# Altium schematic symbol library Schlib.SchLib: 725 symbols (part 2 of 6)
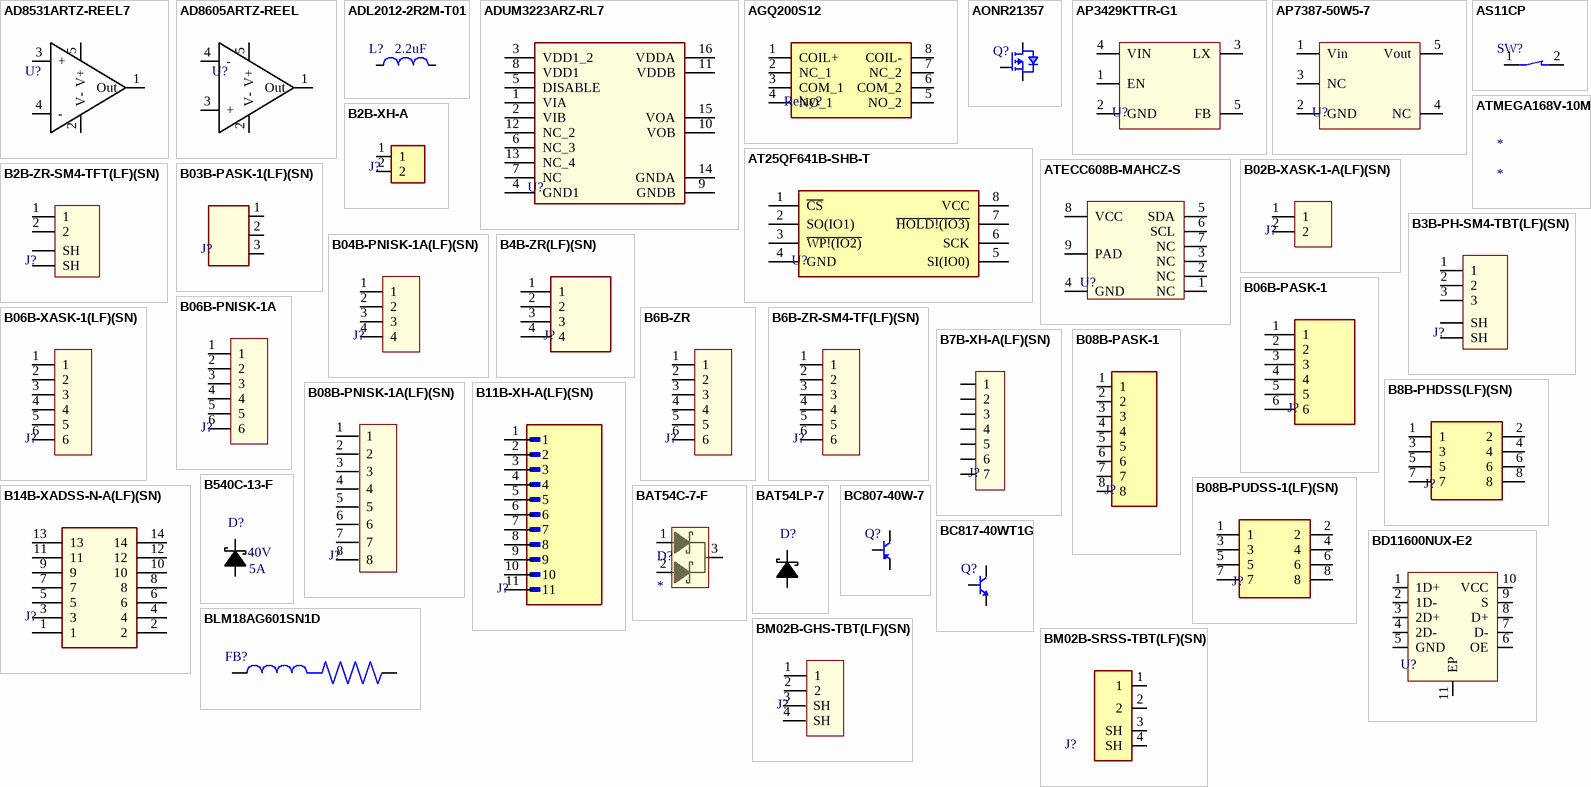
[diagram p22: symbols AD8531ARTZ-REEL7 to BM02B-SRSS-TBT(LF)(SN)]

## AT25QF641B-SHB-T
designator U?  (value not drawn)
Serial Flash Memory 64Mbit 104MHz 2.7V to 3.6V 8-Pin SOP T/R; Manufacturer: Renesas; Manufacturer Part Number: AT25QF641B-SHB-T; Package Body Material: Plastic; Data Retention Time-Min: 20; Endurance: 100000Cycles; Density: 67108864b; Memory Width: 8; Channels: 1; Number of Words Code: 8M; Operating Mode: SYNCHRONOUS; Output Characteristics: 3-STATE; Package Equivalence Code: SOP8,.3; Programming Voltage: 3V; Serial Bus Type: SPI; Standby Current-Max: 25uA; Max Supply Current: 19mA; Write Protection: HARDWARE/SOFTWARE; Supplier: Mouser; Supplier Part Number: 724-AT25QF641B-SHB-T; RoHS: Yes; Category: Memory; Stock: 8673; Pricing: 1=1.14, 10=1.02, 50=1.02, 100=0.994, 1000=0.918, 10000=0.859 (USD); Pins: 8; Case/Package: SOP; Package Shape: Rectangular; Min Operating Temperature: -40°C; Max Operating Temperature: 85°C; Memory Format: FLASH; Type: NOR TYPE; JESD-30 Code: R-PDSO-G8; Moisture Sensitivity Level: 3; Parallel/Serial: SERIAL; Surface Mount: Yes; Technology: CMOS; Terminal Form: Gull Wing; Terminal Position: DUAL; Clock Frequency: 104MHz; Min Supply Voltage: 2.7V; Max Supply Voltage: 3.6V; Nominal Supply Voltage: 3V; Length: 5.29mm; Width: 5.24mm; Height - Seated (Max): 2.16mm; Terminal Pitch: 1.27mm; RoHS Compliant: Yes; Reach SVHC Compliant: No; Temperature Grade: INDUSTRIAL
footprint 8-SOIC
pins: 1 ~{CS}, 2 SO(IO1), 3 ~{WP!(IO2)}, 4 GND, 5 SI(IO0), 6 SCK, 7 ~{HOLD!(IO3)}, 8 VCC

## ATECC608B-MAHCZ-S
designator U?  (value not drawn)
ECC/ECDH SWI, small 3K reel UDFN 8 UDFN 2x3x0.6mm T/R RoHS Compliant: Yes; Manufacturer: Microchip; Manufacturer Part Number: ATECC608B-MAHCZ-S; Supplier: Digi-Key; Supplier Part Number: 150-ATECC608B-MAHCZ-SCT-ND; RoHS: Yes; Stock: 16896; Pricing: 1=0.95000, 25=0.87000 (USD)
footprint ATECC608B-MAHCZ-S
pins: 1 NC, 2 NC, 3 NC, 4 GND, 5 SDA, 6 SCL, 7 NC, 8 VCC, 9 PAD

## ATMEGA168V-10MU
designator *
ATMEGA168V-10MU, 8bit AVR Microcontroller, 10MHz, 16 kB Flash, 32-Pin QFN; Manufacturer: Microchip; Supplier: Arrow Electronics; Supplier Part Number: ATMEGA168V-10MU; Manufacturer Part Number: ATMEGA168V-10MU; RoHS: Yes; Stock: 490; Pricing: 1=3.57 (USD); ComponentLink1URL: https://datasheet.ciiva.com/15122/getdatasheetpartid-87206-15122156.pdf?src-supplier=Verical; ComponentLink1Description: https://datasheet.ciiva.com/15122/getdatasheetpartid-87206-15122156.pdf?src-supplier=Verical; ComponentLink2URL: https://datasheet.ciiva.com/1162/26390-1162032.pdf?src-supplier=Farnell; ComponentLink2Description: https://datasheet.ciiva.com/1162/26390-1162032.pdf?src-supplier=Farnell; ComponentLink3URL: https://datasheet.ciiva.com/6657/2545s-6657574.pdf?src-supplier=Digikey; ComponentLink3Description: https://datasheet.ciiva.com/6657/2545s-6657574.pdf?src-supplier=Digikey; ComponentLink4URL: https://datasheet.ciiva.com/4839/doc2545-53048-4839128.pdf?src-supplier=Mouser; ComponentLink4Description: https://datasheet.ciiva.com/4839/doc2545-53048-4839128.pdf?src-supplier=Mouser; ComponentLink5URL: https://datasheet.ciiva.com/3203/doc2545-3203087.pdf?src-supplier=Avnet; ComponentLink5Description: https://datasheet.ciiva.com/3203/doc2545-3203087.pdf?src-supplier=Avnet; ComponentLink6URL: https://datasheet.ciiva.com/16936/70123998-16936205.pdf?src-supplier=Allied+Electronics; ComponentLink6Description: https://datasheet.ciiva.com/16936/70123998-16936205.pdf?src-supplier=Allied+Electronics; ComponentLink7URL: https://datasheet.ciiva.com/1157/26390-1157458.pdf?src-supplier=Element14; ComponentLink7Description: https://datasheet.ciiva.com/1157/26390-1157458.pdf?src-supplier=Element14; ComponentLink8URL: https://datasheet.ciiva.com/19480/847105-19480231.pdf?src-supplier=Jameco; ComponentLink8Description: https://datasheet.ciiva.com/19480/847105-19480231.pdf?src-supplier=Jameco

## B02B-XASK-1-A(LF)(SN)
designator J?  (value not drawn)
XA Series 2 Position 2.5mm Pitch Top Entry with Boss ThroughHole Shrouded Header; Manufacturer: JST; Manufacturer Part Number: B02B-XASK-1-A(LF)(SN); Supplier: Future Electronics; Supplier Part Number: 4958039; RoHS: Yes; Category: Headers and Wire Housings; Pricing: 1=0.0949, 400=0.0914, 1500=0.0869, 4000=0.0837, 15000=0.0766 (USD); ComponentLink1URL: https://datasheet.ciiva.com/16422/jstb02b-xask-1-a-lf-sn-16422925.pdf?src-supplier=Future+Electronics; ComponentLink1Description: https://datasheet.ciiva.com/16422/jstb02b-xask-1-a-lf-sn-16422925.pdf?src-supplier=Future+Electronics
footprint B02B-XASK-1
pins: 1, 2

## B2B-XH-A
designator J?  (value not drawn)
Connector Header Through Hole 2 position 0.098" (2.50mm); Manufacturer Part Number: B2B-XH-A
footprint JST_B2B-XH-A
pins: 1, 2

## B2B-ZR-SM4-TFT(LF)(SN)
designator J?  (value not drawn)
Conn Shrouded Header HDR 2 POS 1.5mm Solder ST SMD Embossed T/R; Manufacturer: JST; Manufacturer Part Number: B2B-ZR-SM4-TFT(LF)(SN); Number of Contacts: 2NUMBER; Current Rating: 1A; Supplier: Future Electronics; Supplier Part Number: 9517889; RoHS: Yes; Category: Headers and Wire Housings; Stock: 3000; Pricing: 1000=0.305, 2000=0.3, 3000=0.295, 4000=0.29, 5000=0.285 (USD); Lead Free: 5697LeadFree; ComponentLink1URL: https://datasheet.ciiva.com/16417/ezr-16417686.pdf?src-supplier=Future+Electronics; ComponentLink1Description: https://datasheet.ciiva.com/16417/ezr-16417686.pdf?src-supplier=Future+Electronics; ComponentLink2URL: https://datasheet.ciiva.com/26948/getdatasheetpartid-425425-26948538.pdf?src-supplier=Verical; ComponentLink2Description: https://datasheet.ciiva.com/26948/getdatasheetpartid-425425-26948538.pdf?src-supplier=Verical
footprint B2B-ZR-SM4-TFT(LF)(SN)
pins: 1, 2, SH, SH

## B03B-PASK-1(LF)(SN)
designator J?
Connector Header, PA Series, Top Entry, 3 Position, Male Pin, 1 Row, 2.0mm, Through Hole, Natural, With Boss; Part Number: B03B-PASK-1; Manufacturer: JST; Manufacturer Part Number: B03B-PASK-1(LF)(SN); Number of Positions: 3; Current Rating: 3A; Voltage Rating: 250V; Pitch: 2mm; Mated Stacking Heights: 14.9mm; Supplier: Future Electronics; Supplier Part Number: 4332029; RoHS: Yes; Category: Connectors; Stock: 8812; Pricing: 1=0.121, 250=0.118, 750=0.116, 2500=0.113, 7500=0.109 (USD); Mounting Technology: Through Hole; Contact Material: Copper Alloy; Housing Color: White; Contact Shape: Square; Contact Finish - Mating: TIN; Insulation Material: PBT; Insulation Color: Natural; Number of Rows: 1; Fastening Type: Ramp; Packaging: Bulk; Termination: Solder; Number of Contacts: 3; Series: PA; Contact Type: Male Pin; Orientation: Straight; Connector Type: Header; Lead Free: Lead Free; Flammability Rating: UL94 V-0; ComponentLink1URL: https://datasheet.ciiva.com/11750/0900766b805ad157-11750606.pdf?src-supplier=Rs; ComponentLink1Description: https://datasheet.ciiva.com/11750/0900766b805ad157-11750606.pdf?src-supplier=Rs; ComponentLink2URL: https://datasheet.ciiva.com/712/epa-f-712524.pdf?src-supplier=Digikey; ComponentLink2Description: https://datasheet.ciiva.com/712/epa-f-712524.pdf?src-supplier=Digikey; ComponentLink3URL: https://datasheet.ciiva.com/16422/jstb03b-pask-1-lf-sn-16422935.pdf?src-supplier=Future+Electronics; ComponentLink3Description: https://datasheet.ciiva.com/16422/jstb03b-pask-1-lf-sn-16422935.pdf?src-supplier=Future+Electronics
footprint B03B-PASK-1
pins: 1, 2, 3

## B3B-PH-SM4-TBT(LF)(SN)
designator J?  (value not drawn)
Connector Header, PH Series, 3 Position, 2.00mm, 100V, Surface Mount, Solder, Pick and Place, Natural.; Manufacturer: JST; Manufacturer Part Number: B3B-PH-SM4-TBT(LF)(SN); Number of Positions: 3; Number of Contacts: 3NUMBER; Contact Resistance: 20mR; Max Current Rating: 2A; Pitch: 0.079inch; Mated Stacking Heights: 8.6mm; Supplier: CoreStaff; Supplier Part Number: ST63229826; RoHS: Yes; Category: Headers and Wire Housings; Stock: 544; Pricing: 1=228, 20=74.82, 50=49.04, 100=40.44, 300=34.71, 500=33.57, 1000=32.71, 4000=32.06 (JPY); Mounting Technology: Surface Mount; Color: Natural; Contact Material: Copper Alloy; Contact Plating: Tin,Copper; Housing Color: Beige; Housing Material: Polyamide; Contact Shape: Square; Contact Finish - Mating: TIN; Insulation Material: Nylon; Insulation Color: Natural; Min Operating Temperature: -25°C; Max Operating Temperature: 85°C; Number of Rows: 1; Orientation: Straight; Package Quantity: 10; Packaging: Tape and Reel; Termination: Solder; Connector Type: Header; Voltage Rating: 100V; Fastening Type: Detent; Max Voltage Rating (AC): 100V; Series: PH; Contact Type: Male Pin; Length: 9.95mm; Depth: 5mm; Lead Free: Lead Free; Flammability Rating: UL94 V-0; ComponentLink1URL: https://datasheet.ciiva.com/16223/eph-16223093.pdf?src-supplier=Future+Electronics; ComponentLink1Description: https://datasheet.ciiva.com/16223/eph-16223093.pdf?src-supplier=Future+Electronics; ComponentLink2URL: https://datasheet.ciiva.com/732/eph-732906.pdf?src-supplier=Digikey; ComponentLink2Description: https://datasheet.ciiva.com/732/eph-732906.pdf?src-supplier=Digikey
footprint B3B-PH-SM4-TB
pins: 1, 2, 3, SH, SH

## B04B-PNISK-1A(LF)(SN)
designator J?  (value not drawn)
CONN HEADER VERT 4POS 2MM; Manufacturer: JST; Manufacturer Part Number: B04B-PNISK-1A(LF)(SN); Number of Positions: 4; Voltage Rating: 100V; Mated Stacking Heights: 12.25mm; Supplier: Future Electronics; Supplier Part Number: 3128468; RoHS: Yes; Category: Connectors; Stock: 500; Pricing: 500=0.199, 1500=0.193, 2500=0.19, 5000=0.186, 10000=0.179 (USD); Mounting Technology: Through Hole; Contact Material: Copper Alloy; Contact Shape: Square; Contact Finish - Mating: TIN; Insulation Material: Nylon; Insulation Color: Natural; Min Operating Temperature: -25°C; Max Operating Temperature: 85°C; Fastening Type: Latch; Packaging: Bulk; Number of Rows: 1; Termination: Press-Fit; Connector Type: Header; Series: PNI; Contact Type: Male Pin; Flammability Rating: UL94 V-0; ComponentLink1URL: http://www.jst-mfg.com/product/pdf/eng/ePNI.pdf?src-supplier=Digikey; ComponentLink1Description: http://www.jst-mfg.com/product/pdf/eng/ePNI.pdf?src-supplier=Digikey
footprint B04B-PNISK-1A(LF)(SN)
pins: 1, 2, 3, 4

## B4B-ZR(LF)(SN)
designator J?  (value not drawn)
Header for PCB; pitch 1.50mm; 4-contacts; THT; male; top entry; 50V/1A; Manufacturer: JST; Manufacturer Part Number: B4B-ZR(LF)(SN); Body Plating: Tin; Number of Positions: 4; Voltage Rating: 50V; Contact Resistance: 30mR; Current Rating: 1A; Insulation Resistance: 500MR; Pitch: 1.5mm; Panel Thickness: 3.5mm; Supplier: Future Electronics; Supplier Part Number: 4966537; RoHS: Yes; Category: Headers and Wire Housings; Stock: 657; Pricing: 1=0.1, 400=0.0957, 1250=0.0916, 2000=0.0908, 4000=0.0877, 8000=0.0861, 10000=0.0854, 12500=0.0803, 30000=0.081 (USD); Mounting Technology: Through Hole; Contact Plating: Tin,Copper; Contact Material: Brass,Tin,Copper; Color: Natural,White; Housing Color: Beige; Housing Material: Polyamide; Material: Nylon; Min Operating Temperature: -25°C; Max Operating Temperature: 85°C; Packaging: Bulk; Termination: Solder; Number of Rows: 1; Series: ZH; Number of Contacts: 4; Contact Type: Male Pin; Fastening Type: Detent; Orientation: Straight; Max Current Rating: 1A; Max Voltage Rating (AC): 50V; Voltage Rating (AC): 50V; Voltage Rating (DC): 50V; Length: 7.5mm; Depth: 3.5mm; Lead Pitch: 1.5mm; Contact Mating Length: 0.094inch; Lead Free: Lead Free; Flammability Rating: UL94 V-0; Reach SVHC Compliant: No; ComponentLink1URL: https://datasheet.ciiva.com/11752/0900766b8082f580-11752165.pdf?src-supplier=Rs; ComponentLink1Description: https://datasheet.ciiva.com/11752/0900766b8082f580-11752165.pdf?src-supplier=Rs; ComponentLink2URL: https://datasheet.ciiva.com/25616/0900766b81147f94-25616839.pdf?src-supplier=Rs; ComponentLink2Description: https://datasheet.ciiva.com/25616/0900766b81147f94-25616839.pdf?src-supplier=Rs; ComponentLink3URL: https://datasheet.ciiva.com/6747/80551-6747412.pdf?src-supplier=Newark; ComponentLink3Description: https://datasheet.ciiva.com/6747/80551-6747412.pdf?src-supplier=Newark; ComponentLink4URL: https://datasheet.ciiva.com/26894/getdatasheetpartid-731121-26894470.pdf?src-supplier=Verical; ComponentLink4Description: https://datasheet.ciiva.com/26894/getdatasheetpartid-731121-26894470.pdf?src-supplier=Verical; ComponentLink5URL: https://datasheet.ciiva.com/712/ezh-712479.pdf?src-supplier=Digikey; ComponentLink5Description: https://datasheet.ciiva.com/712/ezh-712479.pdf?src-supplier=Digikey; ComponentLink6URL: https://datasheet.ciiva.com/8052/80551-8052053.pdf?src-supplier=Element14; ComponentLink6Description: https://datasheet.ciiva.com/8052/80551-8052053.pdf?src-supplier=Element14; ComponentLink7URL: https://datasheet.ciiva.com/16207/ezr-16207223.pdf?src-supplier=Future+Electronics; ComponentLink7Description: https://datasheet.ciiva.com/16207/ezr-16207223.pdf?src-supplier=Future+Electronics
footprint B4B-ZR(LF)(SN)
pins: 1, 2, 3, 4

## B06B-PASK-1
designator J?
Connector Header Through Hole 6 position 2mm Pitch; Part Number: B06B-PASK-1; Value: B06B-PASK-1
footprint JST_B06B-PASK-1 (Connector Header Through Hole 6 position 2mm Pitch)
pins: 1, 2, 3, 4, 5, 6

## B06B-PNISK-1A
designator J?  (value not drawn)
Connector Header Through Hole 6 position 0.079" (2.00mm); Manufacturer: JST; Manufacturer Part Number: B06B-PNISK-1A; Supplier: Digikey; Supplier Part Number: 455-B06B-PNISK-1A-ND; RoHS: No; Stock: 1496; Pricing: 1=0.54, 10=0.475, 350=0.35757, 700=0.34056, 1050=0.28096, 5250=0.2469, 10150=0.22988 (USD)
footprint B06B-PNISK-1A
pins: 1, 2, 3, 4, 5, 6

## B06B-XASK-1(LF)(SN)
designator J?  (value not drawn)
Conn Shrouded Header (4 Sides) HDR 6 POS 2.5mm Solder ST Top Entry Thru-Hole Box; Manufacturer: JST; Manufacturer Part Number: B06B-XASK-1(LF)(SN); Gender: 29Gender; Supplier: Future Electronics; Supplier Part Number: 2356897; RoHS: Yes; Category: Headers and Wire Housings; Stock: 3210; Pricing: 400=0.162, 1200=0.159, 2000=0.157, 6000=0.154, 10000=0.151 (USD); Weight: 28.349523g; Lead Free: 5697LeadFree; ComponentLink1URL: https://datasheet.ciiva.com/26894/getdatasheetpartid-640326-26894377.pdf?src-supplier=Verical; ComponentLink1Description: https://datasheet.ciiva.com/26894/getdatasheetpartid-640326-26894377.pdf?src-supplier=Verical; ComponentLink2URL: https://datasheet.ciiva.com/29316/741368-da-01-en-stiftleise-6-pol-rm-2-5mm-29316945.pdf?src-supplier=Conrad; ComponentLink2Description: https://datasheet.ciiva.com/29316/741368-da-01-en-stiftleise-6-pol-rm-2-5mm-29316945.pdf?src-supplier=Conrad; ComponentLink3URL: https://datasheet.ciiva.com/8051/80577-8051980.pdf?src-supplier=Element14; ComponentLink3Description: https://datasheet.ciiva.com/8051/80577-8051980.pdf?src-supplier=Element14; ComponentLink4URL: https://datasheet.ciiva.com/726/exa1-726108.pdf?src-supplier=Digikey; ComponentLink4Description: https://datasheet.ciiva.com/726/exa1-726108.pdf?src-supplier=Digikey
pins: 1, 2, 3, 4, 5, 6

## B6B-ZR
designator J?  (value not drawn)
Header B6B-ZR, 1.50mm, 6-contacts, top entry, THT, /2000/box; Manufacturer: JST; Gender: 29Gender; Number of Contacts: 6NUMBER; Supplier: Digikey; Supplier Part Number: 455-B6B-ZR-ND; Manufacturer Part Number: B6B-ZR; RoHS: Yes; Category: Board to Board Connectors; Stock: 63816; Pricing: 1=0.19, 10=0.152, 100=0.1238, 500=0.10728, 2000=0.09599 (USD); Housing Color: 50Colour; Orientation: 5495OrientationType; Lead Free: 5698LeadFree; ComponentLink1URL: https://datasheet.ciiva.com/6905/zhconnector-6905949.pdf?src-supplier=Digikey; ComponentLink1Description: https://datasheet.ciiva.com/6905/zhconnector-6905949.pdf?src-supplier=Digikey
footprint B6B-ZR
pins: 1, 2, 3, 4, 5, 6

## B6B-ZR-SM4-TF(LF)(SN)
designator J?  (value not drawn)
Conn Shrouded Header (4 Sides) HDR 6 POS 1.5mm Solder ST Top Entry SMD T/R; Manufacturer: JST; Manufacturer Part Number: B6B-ZR-SM4-TF(LF)(SN); Supplier: Arrow Electronics; Supplier Part Number: B6B-ZR-SM4-TF(LF)(SN); RoHS: Yes; Category: Board to Board Connectors; Stock: 33000; Pricing: 1000=0.2503, 2000=0.2426, 3000=0.2373, 5000=0.2326, 10000=0.2263, 20000=0.2206 (USD); ComponentLink1URL: https://datasheet.ciiva.com/16422/ezr-16422268.pdf?src-supplier=Future+Electronics; ComponentLink1Description: https://datasheet.ciiva.com/16422/ezr-16422268.pdf?src-supplier=Future+Electronics; ComponentLink2URL: https://datasheet.ciiva.com/15174/getdatasheetpartid-478490-15174613.pdf?src-supplier=Verical; ComponentLink2Description: https://datasheet.ciiva.com/15174/getdatasheetpartid-478490-15174613.pdf?src-supplier=Verical
footprint B6B-ZR
pins: 1, 2, 3, 4, 5, 6

## B7B-XH-A(LF)(SN)
designator J?  (value not drawn)
Conn Shrouded Header HDR 7 POS 2.5mm Solder ST Top Entry Thru-Hole Box; Manufacturer: JST; Manufacturer Part Number: B7B-XH-A(LF)(SN); Number of Positions: 7; Contact Resistance: 20mR; Current Rating: 3A; Voltage Rating: 250V; Insulation Resistance: 1GR; Mated Stacking Heights: 9.8mm; Wire/Cable Gauge: 22AWG; Supplier: Rs; Supplier Part Number: 8201567P; RoHS: Yes; Category: Headers and Wire Housings; Stock: 1740; Pricing: 125=0.138, 500=0.128, 1250=0.122, 2500=0.114 (GBP); Mounting Technology: Through Hole; Contact Plating: Tin,Lead,Copper; Contact Material: Brass; Housing Material: Polyamide; Contact Shape: Square; Insulation Material: Nylon; Insulation Color: Natural; Contact Finish - Mating: TIN; Housing Color: White; Weight: 28.349523g; Min Operating Temperature: -25°C; Max Operating Temperature: 85°C; Number of Rows: 1; Packaging: Bulk; Termination: Solder; Connector Type: Header; Series: XH; Contact Type: Male Pin; Fastening Type: Detent; Orientation: Straight; Voltage Rating (AC): 250V; Max Current Rating: 3A; Number of Contacts: 7; Max Voltage Rating (AC): 250V; Length: 19.9mm; Pitch: 2.5mm; Lead Pitch: 2.5mm; Depth: 5.75mm; Lead Free: Lead Free; Flammability Rating: UL94 V-0; Reach SVHC Compliant: No; ComponentLink1URL: https://datasheet.ciiva.com/11747/0900766b80826551-11747681.pdf?src-supplier=Rs; ComponentLink1Description: https://datasheet.ciiva.com/11747/0900766b80826551-11747681.pdf?src-supplier=Rs; ComponentLink2URL: https://datasheet.ciiva.com/26894/getdatasheetpartid-440406-26894811.pdf?src-supplier=Verical; ComponentLink2Description: https://datasheet.ciiva.com/26894/getdatasheetpartid-440406-26894811.pdf?src-supplier=Verical
pins: 1, 2, 3, 4, 5, 6, 7

## B08B-PASK-1
designator J?
Connector Header Through Hole 8 position 2mm Pitch; Part Number: B08B-PASK-1; Value: B08B-PASK-1
footprint JST_B08B-PASK-1 (Connector Header Through Hole 8 position 2mm Pitch)
pins: 1, 2, 3, 4, 5, 6, 7, 8

## B8B-PHDSS(LF)(SN)
designator J?  (value not drawn)
Connector Header, Through Hole, 8 position, 2.00mm Pitch, 250V, 28-22 AWG, Natural; Manufacturer: JST; Manufacturer Part Number: B8B-PHDSS(LF)(SN); Number of Contacts: 8NUMBER; Supplier: Arrow Electronics; Supplier Part Number: B8B-PHDSS(LF)(SN); RoHS: Yes; Category: Headers and Wire Housings; Stock: 18764; Pricing: 1=0.4486, 10=0.3549, 25=0.3514, 50=0.3478, 100=0.2373, 1000=0.1805 (USD); ComponentLink1URL: https://datasheet.ciiva.com/16418/ephd-16418246.pdf?src-supplier=Future+Electronics; ComponentLink1Description: https://datasheet.ciiva.com/16418/ephd-16418246.pdf?src-supplier=Future+Electronics
footprint B8B-PHDSS(LF)(SN)
pins: 1, 2, 3, 4, 5, 6, 7, 8

## B08B-PNISK-1A(LF)(SN)
designator J?  (value not drawn)
Wire to Board Connectors; Manufacturer: JST; Manufacturer Part Number: B08B-PNISK-1A(LF)(SN); Supplier: Future Electronics; Supplier Part Number: 6128586; RoHS: No; Category: Uncategorized; Pricing: 250=0.375, 750=0.365, 2500=0.355, 3750=0.35 (USD)
footprint B08B-PNISK-1A
pins: 1, 2, 3, 4, 5, 6, 7, 8

## B08B-PUDSS-1(LF)(SN)
designator J?  (value not drawn)
Top Entry Type 8 circuit Through-hole Type Shrouded Header with Boss; Manufacturer: JST; Manufacturer Part Number: B08B-PUDSS-1(LF)(SN); Current Rating: 3A; Supplier: Rs; Supplier Part Number: 9060155P; RoHS: Yes; Category: Headers and Wire Housings; Stock: 3190; Pricing: 10=0.153 (GBP); ComponentLink1URL: https://datasheet.ciiva.com/730/epud-730759.pdf?src-supplier=Digikey; ComponentLink1Description: https://datasheet.ciiva.com/730/epud-730759.pdf?src-supplier=Digikey; ComponentLink2URL: https://datasheet.ciiva.com/16417/epud-16417518.pdf?src-supplier=Future+Electronics; ComponentLink2Description: https://datasheet.ciiva.com/16417/epud-16417518.pdf?src-supplier=Future+Electronics
footprint B08B-PASK-1
pins: 1, 2, 3, 4, 5, 6, 7, 8

## B11B-XH-A(LF)(SN)
designator J?  (value not drawn)
Conn Shrouded Header (4 Sides) HDR 11 POS 2.5mm Solder ST Top Entry Thru-Hole Box; Manufacturer: JST; Manufacturer Part Number: B11B-XH-A(LF)(SN); Connector Type: Male Pin; Contact Resistance: 20mΩ; Current Rating: 3A; Gender: Male; Insulation Resistance: 1GΩ; Number of Contacts: 11; Pitch: 2.4892mm; Voltage Rating: 250V; Wire/Cable Gauge: 22AWG; Supplier: Future Electronics; Supplier Part Number: 2002590; RoHS: Compliant; Category: Headers and Wire Housings; Stock: 250; Pricing: 250=0.166, 750=0.162, 2500=0.159, 5000=0.157, 10000=0.153 (USD); Color: Natural; Contact Gender: Male; Contact Material: Brass; Contact Plating: Tin; Height: 7mm; Lead Free: Lead Free; Lead Pitch: 2.5mm; Length: 6.35mm; Lifecycle Status: Production; Max Operating Temperature: 85°C; Min Operating Temperature: -25°C; Mounting Technology: Through Hole; Pins: 11; Number of Positions: 11; Number of Rows: 1; Orientation: Straight; REACH SVHC: No; Terminal Pitch: 2.5mm; Termination: Press-Fit, Solder; Voltage Rating (AC): 250V; Weight: 9.071847g; Width: 6.35mm; ComponentLink1URL: https://datasheet.octopart.com:443/B11B-XH-A%28LF%29%28SN%29-JST-datasheet-140264791.pdf?src-supplier=Upverter; ComponentLink1Description: https://datasheet.octopart.com:443/B11B-XH-A%28LF%29%28SN%29-JST-datasheet-140264791.pdf?src-supplier=Upverter; ComponentLink2URL: https://datasheet.octopart.com:443/B11B-XH-A%28LF%29%28SN%29-JST-datasheet-138896056.pdf?src-supplier=IHS; ComponentLink2Description: https://datasheet.octopart.com:443/B11B-XH-A%28LF%29%28SN%29-JST-datasheet-138896056.pdf?src-supplier=IHS; ComponentLink3URL: https://datasheet.octopart.com:443/B11B-XH-A%28LF%29%28SN%29-JST-datasheet-63094.pdf?src-supplier=element14+APAC; ComponentLink3Description: https://datasheet.octopart.com:443/B11B-XH-A%28LF%29%28SN%29-JST-datasheet-63094.pdf?src-supplier=element14+APAC; ComponentLink4URL: https://datasheet.octopart.com:443/B11B-XH-A-%28LF%29%28SN%29-JST-datasheet-62330224.pdf?src-supplier=element14+APAC; ComponentLink4Description: https://datasheet.octopart.com:443/B11B-XH-A-%28LF%29%28SN%29-JST-datasheet-62330224.pdf?src-supplier=element14+APAC; ComponentLink5URL: https://datasheet.octopart.com:443/B11B-XH-A%28LF%29%28SN%29-JST-datasheet-12510042.pdf?src-supplier=Future+Electronics; ComponentLink5Description: https://datasheet.octopart.com:443/B11B-XH-A%28LF%29%28SN%29-JST-datasheet-12510042.pdf?src-supplier=Future+Electronics; ComponentLink6URL: https://datasheet.octopart.com:443/B11B-XH-A%28LF%29%28SN%29-JST-datasheet-8325564.pdf?src-supplier=Future+Electronics; ComponentLink6Description: https://datasheet.octopart.com:443/B11B-XH-A%28LF%29%28SN%29-JST-datasheet-8325564.pdf?src-supplier=Future+Electronics
footprint B11B-XH-A(LF)(SN)
pins: 1, 2, 3, 4, 5, 6, 7, 8, 9, 10, 11

## B14B-XADSS-N-A(LF)(SN)
designator J?  (value not drawn)
Connector, 2.5mm Pitch, Double-Row Construction, Secure Locking Device, Header Wafer made of Solder Crack Preventive...; Manufacturer: JST; Manufacturer Part Number: B14B-XADSS-N-A(LF)(SN); Number of Positions: 14; Supplier: Digi-Key; Supplier Part Number: B14B-XADSS-N-A(LF)(SN)-ND; RoHS: Yes; Category: Connectors; Pricing: 150=0.56267 (USD); Termination: Crimp; Pitch: 2.5mm; Lead Free: Lead Free; ComponentLink1URL: http://www1.futureelectronics.com/doc/JST/B14B-XADSS-N-A(LF)(SN).pdf?src-supplier=Future+Electronics; ComponentLink1Description: http://www1.futureelectronics.com/doc/JST/B14B-XADSS-N-A(LF)(SN).pdf?src-supplier=Future+Electronics
footprint B14B-XADSS-N-A
pins: 1, 2, 3, 4, 5, 6, 7, 8, 9, 10, 11, 12, 13, 14

## B540C-13-F
designator D?  Max Repetitive Reverse Voltage (Vrrm): 40V  Forward Current: 5A  (hidden comment: *)
Rectifier Diode, Schottky, 1 Phase, 1 Element, 5A, 40V V(RRM), Silicon; Manufacturer: Diodes; Manufacturer Part Number: B540C-13-F; Max Reverse Current: 500uA; Polarity: Standard; Forward Voltage: 550mV; Max Forward Surge Current (Ifsm): 100A; Value: 300pF; Supplier: Future Electronics; Supplier Part Number: 8485369; RoHS: Yes; Category: Rectifier Diodes; Stock: 249000; Pricing: 3000=0.147, 6000=0.144, 9000=0.142, 12000=0.141, 15000=0.137 (USD); Mounting Technology: Surface Mount; Case/Package: SMC; Weight: 0.007408oz; Min Operating Temperature: -55°C; Max Operating Temperature: 125°C; Packaging: Tape and Reel; Package Quantity: 3000; Output Current: 5A; Series: -; Average Rectified Current: 5A; Termination: SMD/SMT; Voltage Rating (DC): 40V; Current Rating: 5A; Max Reverse Voltage (DC): 40V; Current: 5A; Voltage: 40V; Length: 7.11mm; Width: 6.22mm; Height: 2.5mm; Lead Free: Lead Free; RoHS Compliant: Yes
footprint DO-214AC, SMA
pins: 1 C, 2 A

## BAT54C-7-F
designator D?
BAT54 Series 30 V 600 mA Surface Mount Schottky Barrier Diode - SOT-23; Manufacturer: Diodes Inc.; Manufacturer Part Number: BAT54C-7-F; Average Rectified Current: 200mA; Value: 10pF; Element Configuration: Common Cathode; Forward Voltage: 240mV; Max Forward Surge Current (Ifsm): 600mA; Max Junction Temperature (Tj): 150°C; Max Power Dissipation: 200mW; Max Repetitive Reverse Voltage (Vrrm): 30V; Number of Elements: 2; Peak Reverse Current: 2µA; Reverse Recovery Time: 5ns; Supplier: RS; Supplier Part Number: 7384838P; RoHS: Compliant; Category: Schottky Diodes; Stock: 132400; Pricing: 1000=0.017, 2000=0.012, 5000=0.011, 10000=0.010 (GBP); Case/Package: SOT-23; China RoHS: Compliant; Contact Plating: Tin; Current Rating: 200mA; Forward Current: 200mA; Height: 1.1mm; Lead Free: Lead Free; Length: 2.9mm; Lifecycle Status: Production; Max Operating Temperature: 150°C; Max Output current: 200mA; Max Reverse Voltage (DC): 30V; Min Operating Temperature: -65°C; Mounting Technology: Surface Mount; Pins: 3; Number of Terminals: 3; Packaging: Cut Tape; Peak Non-Repetitive Surge Current: 600mA; Power Dissipation: 200mW; Power Rating: 200mW; Radiation Hardening: No; REACH SVHC: Yes; Reverse Standoff Voltage: 30V; Reverse Voltage: 30V; Schedule B: 8541100070, 8541100070|8541100070|8541100070|8541100070|8541100070|8541100070|8541100070|8541100070|8541100070|8541100070|8541100070|8541100070|8541100070|8541100070|8541100070|8541100070|8541100070|8541100070|8541100070|8541100070|8541100070|8541100070|8541100070|85; Termination: SMD/SMT; Voltage Rating (DC): 30V; Weight: 7.994566mg; Width: 1.3mm; ComponentLink1URL: https://datasheet.octopart.com:443/BAT54C-7-F-Diodes-Inc.-datasheet-180551411.pdf?src-supplier=IHS; ComponentLink1Description: https://datasheet.octopart.com:443/BAT54C-7-F-Diodes-Inc.-datasheet-180551411.pdf?src-supplier=IHS; ComponentLink2URL: https://datasheet.octopart.com:443/BAT54C-7-F-Diodes-Inc.-datasheet-134530442.pdf?src-supplier=Future+Electronics; ComponentLink2Description: https://datasheet.octopart.com:443/BAT54C-7-F-Diodes-Inc.-datasheet-134530442.pdf?src-supplier=Future+Electronics; ComponentLink3URL: https://sigma.octopart.com:443/138706058/technical_drawing/Diodes-Inc.-BAT54C-7-F.pdf?src-supplier=Upverter; ComponentLink3Description: https://sigma.octopart.com:443/138706058/technical_drawing/Diodes-Inc.-BAT54C-7-F.pdf?src-supplier=Upverter; ComponentLink4URL: https://datasheet.octopart.com:443/BAT54C-7-F-Diodes-Inc.-datasheet-11970926.pdf?src-supplier=element14+APAC; ComponentLink4Description: https://datasheet.octopart.com:443/BAT54C-7-F-Diodes-Inc.-datasheet-11970926.pdf?src-supplier=element14+APAC; ComponentLink5URL: https://datasheet.octopart.com:443/BAT54C-7-F-Diodes-Inc.-datasheet-10029091.pdf?src-supplier=element14+APAC; ComponentLink5Description: https://datasheet.octopart.com:443/BAT54C-7-F-Diodes-Inc.-datasheet-10029091.pdf?src-supplier=element14+APAC; ComponentLink6URL: https://datasheet.octopart.com:443/BAT54C-7-F-Diodes-Inc.-datasheet-5320128.pdf?src-supplier=element14+APAC; ComponentLink6Description: https://datasheet.octopart.com:443/BAT54C-7-F-Diodes-Inc.-datasheet-5320128.pdf?src-supplier=element14+APAC; ComponentLink7URL: https://datasheet.octopart.com:443/BAT54C-7-F-Diodes-Inc.-datasheet-41168498.pdf?src-supplier=element14+APAC; ComponentLink7Description: https://datasheet.octopart.com:443/BAT54C-7-F-Diodes-Inc.-datasheet-41168498.pdf?src-supplier=element14+APAC; ComponentLink8URL: https://datasheet.octopart.com:443/BAT54C-7-F-Diodes-Inc.-datasheet-160645956.pdf?src-supplier=Newark; ComponentLink8Description: https://datasheet.octopart.com:443/BAT54C-7-F-Diodes-Inc.-datasheet-160645956.pdf?src-supplier=Newark; ComponentLink9URL: https://datasheet.octopart.com:443/BAT54C-7-F-Diodes-Inc.-datasheet-41192442.pdf?src-supplier=Newark; ComponentLink9Description: https://datasheet.octopart.com:443/BAT54C-7-F-Diodes-Inc.-datasheet-41192442.pdf?src-supplier=Newark; ComponentLink10URL: https://datasheet.octopart.com:443/BAT54C-7-F-Diodes-Inc.-datasheet-25663.pdf?src-supplier=DigiKey; ComponentLink10Description: https://datasheet.octopart.com:443/BAT54C-7-F-Diodes-Inc.-datasheet-25663.pdf?src-supplier=DigiKey; ComponentLink11URL: https://datasheet.octopart.com:443/BAT54C-7-F-Diodes-Inc.-datasheet-127371552.pdf?src-supplier=TME; ComponentLink11Description: https://datasheet.octopart.com:443/BAT54C-7-F-Diodes-Inc.-datasheet-127371552.pdf?src-supplier=TME; ComponentLink12URL: https://datasheet.octopart.com:443/BAT54C-7-F-Diodes-Inc.-datasheet-32841569.pdf?src-supplier=RS+(Formerly+Allied+Electronics); ComponentLink12Description: https://datasheet.octopart.com:443/BAT54C-7-F-Diodes-Inc.-datasheet-32841569.pdf?src-supplier=RS+(Formerly+Allied+Electronics); ComponentLink13URL: https://datasheet.octopart.com:443/BAT54C-7-F-Diodes-Inc.-datasheet-14051808.pdf?src-supplier=iiiC; ComponentLink13Description: https://datasheet.octopart.com:443/BAT54C-7-F-Diodes-Inc.-datasheet-14051808.pdf?src-supplier=iiiC; ComponentLink14URL: https://datasheet.octopart.com:443/BAT54C-7-F-Diodes-Inc.-datasheet-11804708.pdf?src-supplier=Arrow+Electronics; ComponentLink14Description: https://datasheet.octopart.com:443/BAT54C-7-F-Diodes-Inc.-datasheet-11804708.pdf?src-supplier=Arrow+Electronics; ComponentLink15URL: https://datasheet.octopart.com:443/BAT54C-7-F-Diodes-Inc.-datasheet-10836317.pdf?src-supplier=Garrett; ComponentLink15Description: https://datasheet.octopart.com:443/BAT54C-7-F-Diodes-Inc.-datasheet-10836317.pdf?src-supplier=Garrett
footprint SOT-23-3
pins: 1 A1, 2 A2, 3 C
